# Altium footprint library Cty1.PcbLib: 1378 footprints (part 78 of 87)
Each footprint in its own frame and in the unit in brackets; x right, y up, seen from the top. Pads: shape width x height; smd on the part's side, far side on the other; paste and mask are expansions set on the pad; w line width, h text height; cw(c..) or ccw(c..) is an arc to the next point about the centre after c.
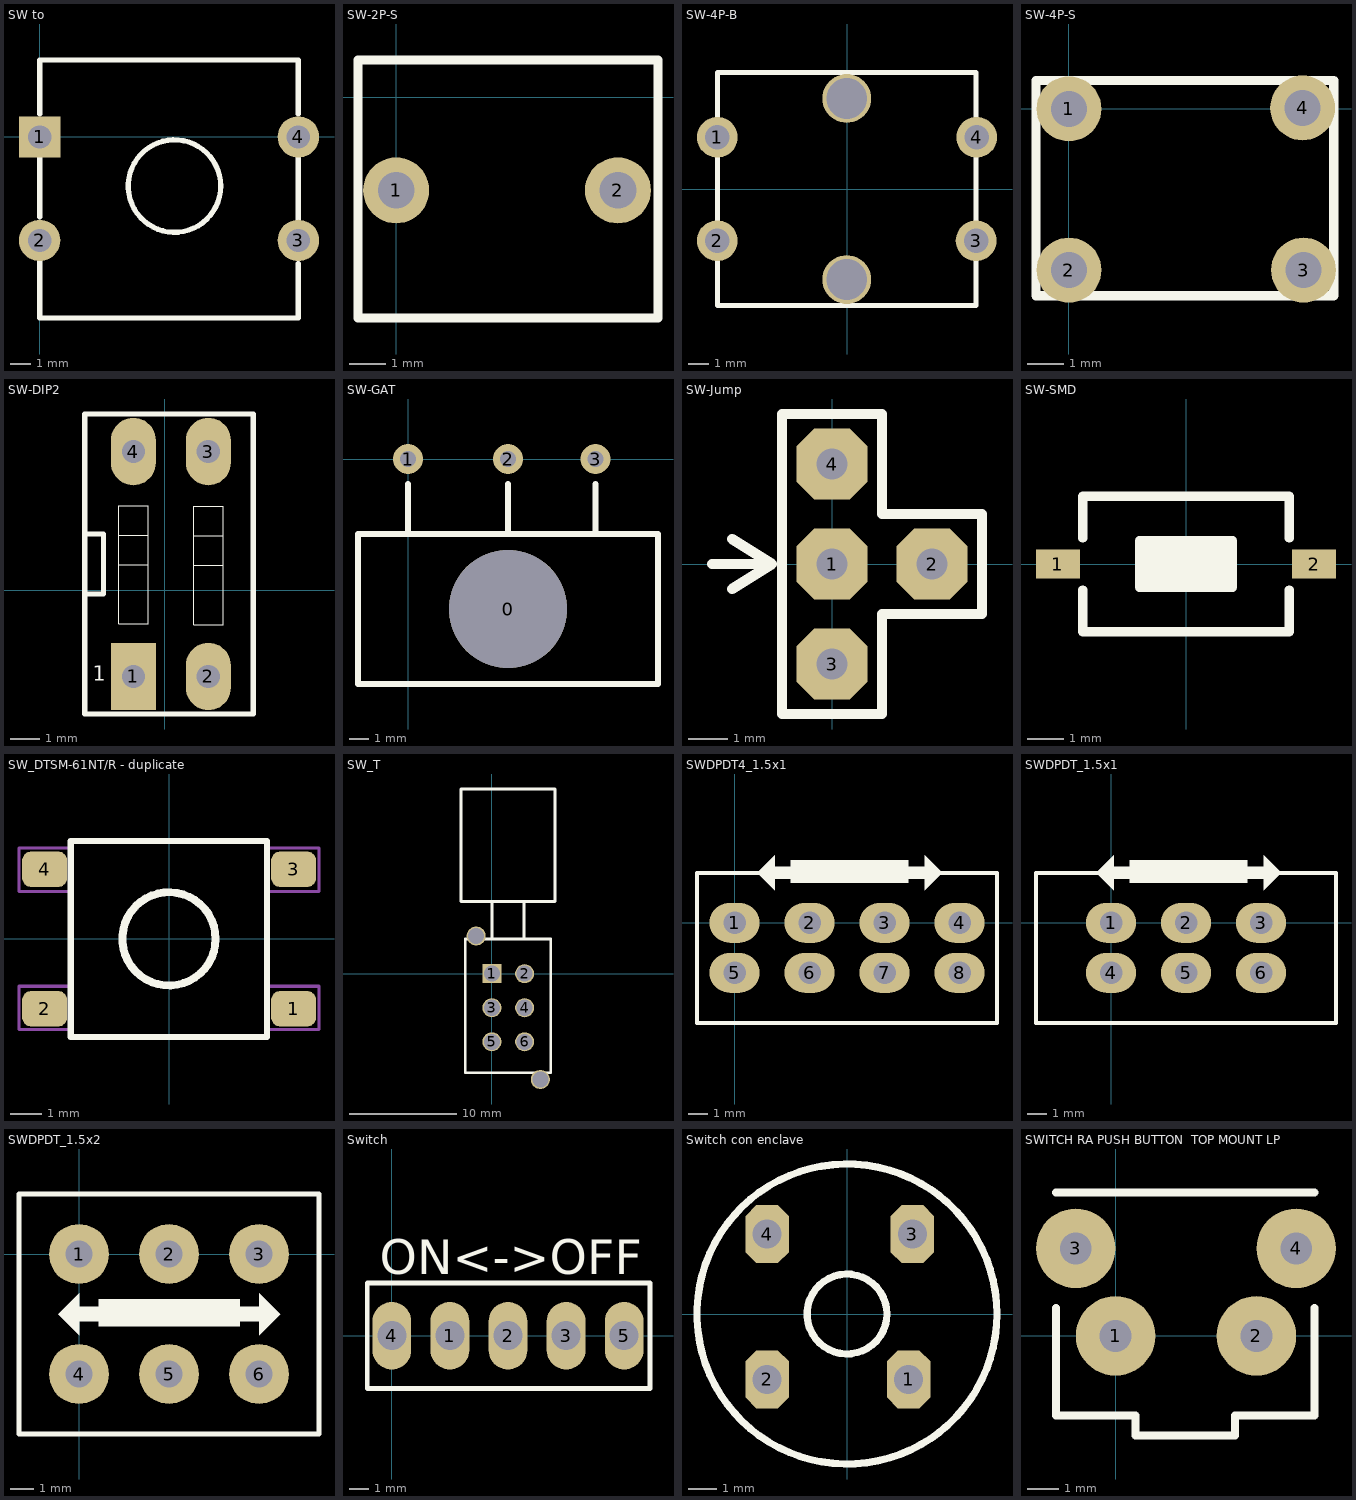
[diagram p77: the footprints below, top view; thin cyan lines are the x and y axes]

## SW to [mil] "12,7x5.08mm"
pads (4):
  rect 80x80 hole 45 unplated: 1(0,0)
  round 80 hole 45 unplated: 2(0,-200) 3(500,-200) 4(500,0)
Top Overlay:
  circle w10: c260.56,-95 r89.44
  lines w10: 0,-240 0,-350 500,-350 500,-245 ; 0,-155 0,-40 ; 0,45 0,148.7 500,148.7 500,45 ; 500,-160 500,-40

## SW-2P-S [mm]
height 5.59
pads (2):
  round 1.8 hole 1: 1(0,-2.54) 2(6.045,-2.54)
Top Overlay:
  lines w0.254: -1.041,-6.02 7.137,-6.02 7.137,1.016 -1.041,1.016 -1.041,-6.02

## SW-4P-B [mm] "Nut bam lon"
pads (6):
  round 2 hole 1.2: 1(-6.375,2.54) 2(-6.375,-2.54) 3(6.325,-2.54) 4(6.35,2.54)
  round 2.4 hole 2: ""(-0.025,-4.445) ""(-0.025,4.445)
Top Overlay:
  lines w0.254: -6.375,-5.715 6.325,-5.715 6.325,5.715 -6.375,5.715 -6.375,-5.715
3D body "User Library-Button-BIG-4.step": height 9.5, standoff -3.5, extent -6.936,-6 6.937,6

## SW-4P-S [mm]
height 5.59
pads (4):
  round 1.8 hole 1: 1(0,0) 2(0,-4.47) 3(6.502,-4.47) 4(6.477,0.025)
Top Overlay:
  lines w0.254: -0.914,-5.182 7.341,-5.182 7.341,0.787 6.934,0.787 -0.914,0.787 -0.914,-5.182
3D body "User Library-Button-small-4pin.step": height 9.52, standoff -3.48, extent -0.864,-5.235 7.348,0.765

## SW-DIP2 [mil]
pads (4):
  rect 60x90 hole 31: 1(-42,-115)
  oval 60x90 hole 31: 2(58,-115) 3(58,185) 4(-42,185)
Top Overlay:
  lines w1.5: -61.69,34 -22.32,34 ; -61.69,73.37 -22.32,73.37 ; 38.31,33 77.69,33 ; 38.31,72.37 77.69,72.37 ; -61.69,-44.74 -61.69,112.74 -22.32,112.74 -22.32,-44.74 -61.69,-44.74 ; 38.31,-45.74 38.31,111.74 77.69,111.74 77.69,-45.74 38.31,-45.74
  lines w7: -107,-5 -82,-5 -82,75 -107,75 ; -107,-165 -107,235 118,235 118,-165 -107,-165
  text "1" at -96,-121 h20
3D body "User Library-Switch-Piano-DIP-2.STEP": height 354.33, standoff -157.48, extent -108.22,-218.43 128,228.43

## SW-GAT [mm]
pads (4):
  round 6 hole 6: 0(5.08,-7.62)
  round 1.524 hole 0.8: 1(0,0) 2(5.08,0) 3(9.525,0)
Top Overlay:
  lines w0.305: 0,-3.81 0,-1.27 ; 5.08,-3.81 5.08,-1.27 ; 9.525,-3.81 9.525,-1.27 ; -2.54,-11.43 12.7,-11.43 12.7,-3.81 -2.54,-3.81 -2.54,-11.43

## SW-Jump [mm]
pads (4):
  oct 1.8x1.8 hole 0.8: 1(0,0) 2(2.54,0) 3(0,-2.54) 4(0,2.54)
Top Overlay:
  lines w0.254: -3.048,0 -1.524,0 ; -2.54,-0.635 -1.524,0 ; -2.54,0.635 -1.524,0 ; -1.27,-3.81 -1.27,1.27 -1.27,-1.27 -1.27,3.81 1.27,3.81 1.27,1.27 3.81,1.27 3.81,-1.27 1.27,-1.27 1.27,-3.81 -1.27,-3.81

## SW-SMD [mm] "Switch SMD type"
pads (2):
  rect 1.2x0.8 smd: 1(-3.5,0) 2(3.5,0)
Top Overlay:
  rectangle: -1.27,-0.635 1.27,0.635
  lines w0.254: -2.819,-0.711 -2.819,-1.854 2.819,-1.854 2.819,-0.711 ; -2.819,0.711 -2.819,1.854 2.819,1.854 2.819,0.711 ; -1.27,-0.635 1.27,-0.635 1.27,0.635 -1.27,0.635 -1.27,-0.635
3D body "User Library-Button-SMD.step": height 2.5, standoff 0, extent -3.05,-1.85 3.05,1.85

## SW_DTSM-61NT/R - duplicate [mm] "Buttom Push SMD"
pads (4):
  rrect50% 1.448x1.143 smd: 1(4.01,-2.25) 2(-4,-2.25) 3(4.01,2.24) 4(-4,2.24)
Top Overlay:
  circle w0.254: c0,0 r1.5
  lines w0.2: -3.16,-3.16 3.15,-3.16 3.15,3.15 -3.16,3.15 -3.16,-3.16
Mechanical 7:
  circle w0.1: c0,0 r1.5
  lines w0.1: -3.16,-2.921 -4.826,-2.921 -4.826,-1.524 -3.16,-1.524 ; -3.16,1.524 -4.826,1.524 -4.826,2.921 -3.16,2.921 ; 3.15,-2.921 4.826,-2.921 4.826,-1.524 3.15,-1.524 ; 3.15,1.524 4.826,1.524 4.826,2.921 3.15,2.921 ; -3.16,-3.16 -3.16,3.15 3.15,3.15 3.15,-3.16 -3.16,-3.16
3D body "Switch SPNO - DTSM-6.stp": height 4.5, standoff 0, extent -4.5,-3.1 4.5,3.1

## SW_T [mil]
pads (8):
  rect 70x70 hole 59.06 unplated: 1(0,0)
  round 70 hole 59.06 unplated: 2(120.08,0) 3(0,-125.2) 4(120.08,-125.2) 5(0,-250.39) 6(120.08,-250.39) ""(-58,138.58) ""(178,-388.98)
Top Overlay:
  lines w10: 0,127.95 0,265.8 ; 84,127.95 118.11,127.95 118.11,265.8 ; -114.17,265.8 -114.17,679.18 59.06,679.18 232.28,679.18 232.28,265.8 -114.17,265.8 ; -98.43,-364.17 -98.43,127.95 108,127.95 216.54,127.95 216.54,-364.17 -98.43,-364.17

## SWDPDT4_1.5x1 [mil] "Switch 3 DPDT, Pin to Pin 150mil, Row to Row 100mil"
pads (8):
  oval 100x80 hole 45: 1(0,0) 2(150,0) 3(300,0) 4(450,0) 5(0,-100) 6(150,-100) 7(300,-100) 8(450,-100)
Top Overlay:
  region: 112.5,125 347.5,125 347.5,80 112.5,80
  region: 380,135 380,65 415,100
  region: 80,135 80,65 45,100
  lines w8: -75,-200 -75,100 525,100 525,-200 -75,-200
  lines w25: 75,100 125,100 ; 335,100 385,100

## SWDPDT_1.5x1 [mil] "Switch DPDT, Pin to Pin 150mil, Row to Row 100mil"
pads (6):
  oval 100x80 hole 45: 1(0,0) 2(150,0) 3(300,0) 4(0,-100) 5(150,-100) 6(300,-100)
Top Overlay:
  region: 5,135 5,65 -30,100
  region: 305,135 305,65 340,100
  region: 37.5,125 272.5,125 272.5,80 37.5,80
  lines w8: -150,-200 450,-200 450,100 -150,100 -150,-200
  lines w25: 0,100 50,100 ; 260,100 310,100

## SWDPDT_1.5x2 [mil] "Switch DPDT, Pin to Pin 150mil, Row to Row 200mil"
pads (6):
  round 100 hole 45: 1(0,0) 2(150,0) 3(300,0) 4(0,-200) 5(150,-200) 6(300,-200)
Top Overlay:
  region: 0,-65 0,-135 -35,-100
  region: 300,-65 300,-135 335,-100
  region: 32.5,-75 267.5,-75 267.5,-120 32.5,-120
  lines w8: -100,-300 400,-300 400,100 -100,100 -100,-300
  lines w25: -5,-100 45,-100 ; 255,-100 305,-100

## Switch [mm]
pads (5):
  oval 2x3.5 hole 1.5: 1(3,0) 2(6,0) 3(9,0) 4(0,0) 5(12,0)
Top Overlay:
  lines w0.254: -1.27,-2.73 -1.27,2.73 13.335,2.73 13.335,-2.73 -1.27,-2.73
  text "ON<->OFF" at -0.635,3.175 h1.8
3D body "User Library-Assem1-20.STEP": height 2.6, standoff -6, extent -0.5,-2.85 12.5,9.35

## Switch con enclave [mil]
pads (4):
  oct 60x80 hole 40: 1(85,-90) 2(-110,-90) 3(90,110) 4(-110,110)
Top Overlay:
  circle w10: c0,0 r206.7
  circle w10: c0,0 r55
Mechanical 1:
  rectangle: -109.02,-105.24 -89.02,-85.24
  rectangle: 86.38,-105.24 106.38,-85.24
  rectangle: -104.02,89.76 -84.02,109.76
  rectangle: 91.38,89.76 111.38,109.76
3D body "SW3dPS-power_switch.STEP": height 452.22, standoff -196.06, extent -223.44,-225 223.45,245.32

## SWITCH RA PUSH BUTTON  TOP MOUNT LP [mil] "SWITCH RA PUSH BUTTON  TOP MOUNT LP"
pads (4):
  round 100 hole 40: 1(0,0) 2(177,0) 3(-50,110) 4(227,110)
Top Overlay:
  lines w10: -75,35 -75,-100 25,-100 25,-125 150,-125 150,-100 250,-100 250,35 ; -75,180 250,180
Bottom Overlay:
  lines w10: -75,35 -75,-100 25,-100 25,-125 150,-125 150,-100 250,-100 250,35 ; -75,180 250,180
3D body "User Library-SWT6-R6K.step": height 305.83, standoff -139.06, extent -79.14,-325.59 243.63,160.63